# Altium footprint library Inductors SMD.PcbLib: 145 footprints (part 6 of 10)
Each footprint in its own frame and in the unit in brackets; x right, y up, seen from the top. Pads: shape width x height; smd on the part's side, far side on the other; paste and mask are expansions set on the pad; w line width, h text height; cw(c..) or ccw(c..) is an arc to the next point about the centre after c.
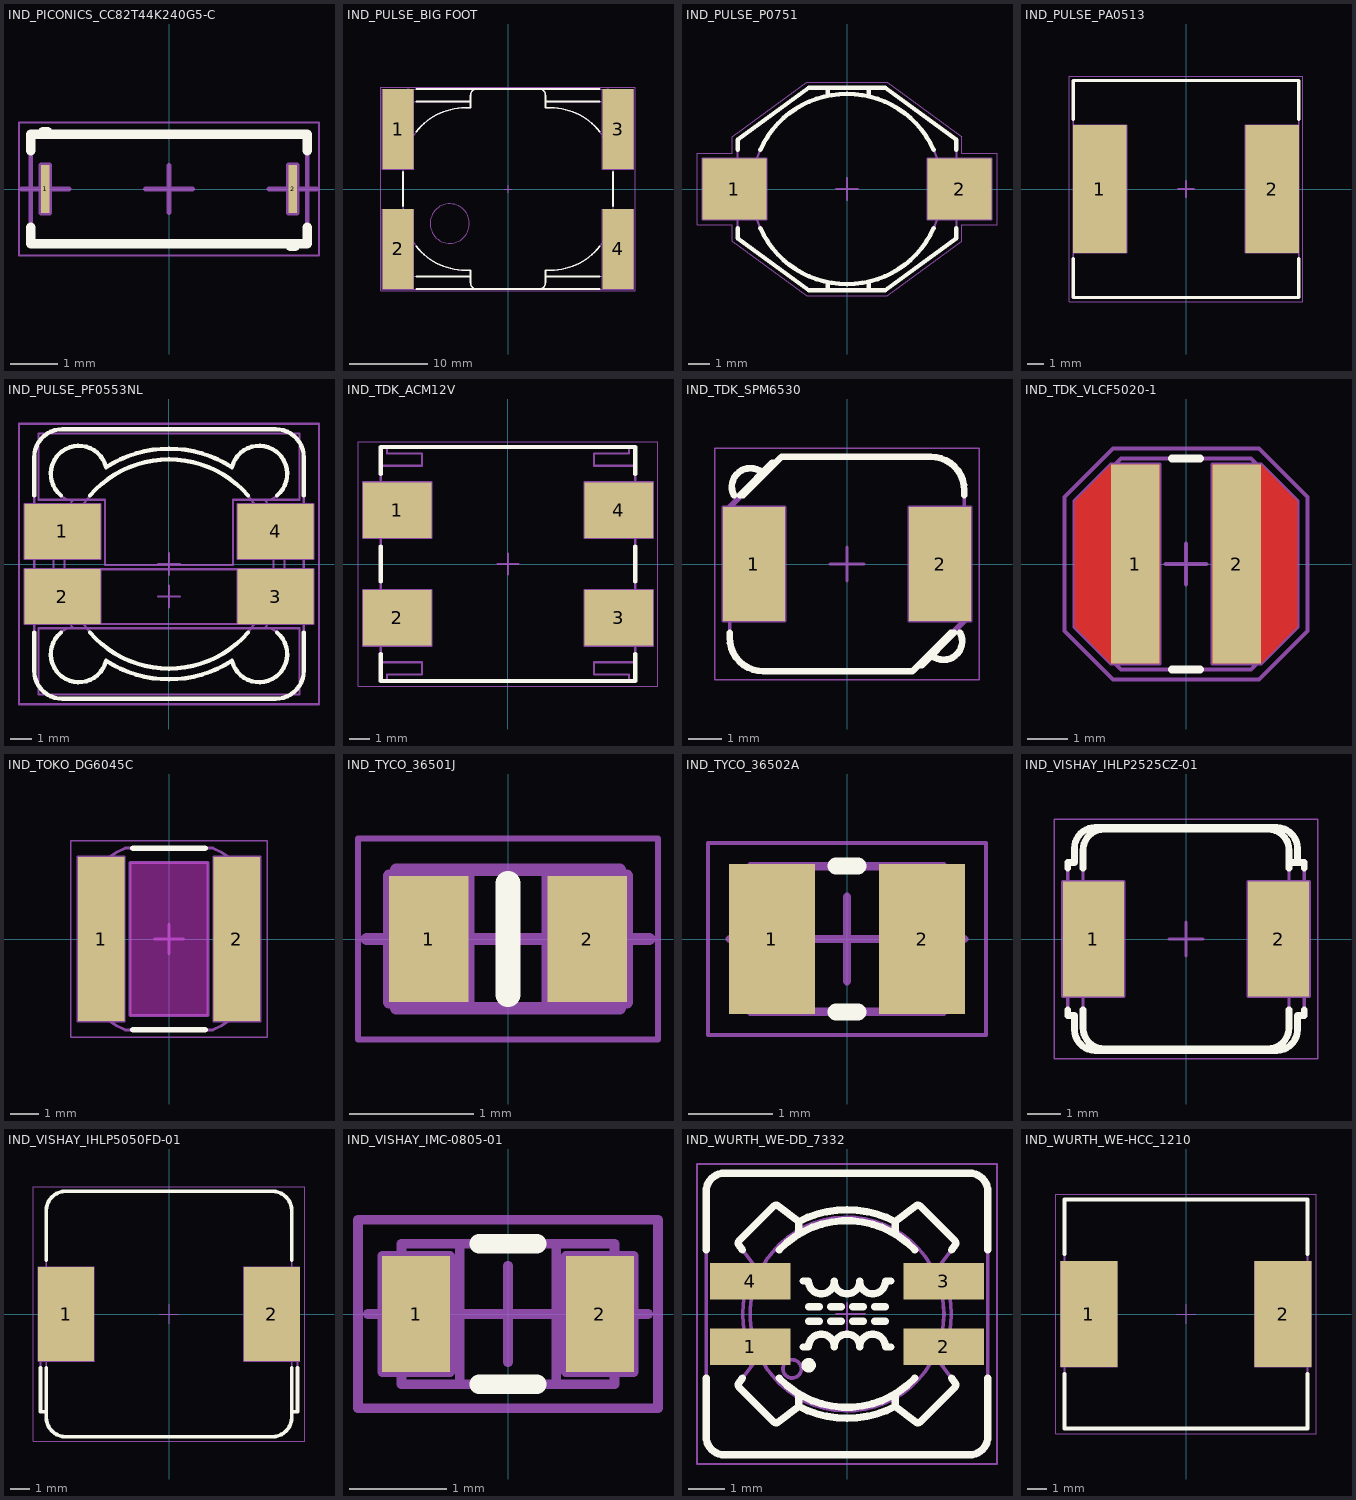
[diagram p5: the footprints below, top view; thin cyan lines are the x and y axes]

## IND_PICONICS_CC82T44K240G5-C [mil] "SMT Conical Inductor, Body 5.842x2.3114mm"
height 95.98
pads (2):
  rect 7.01x40 smd: 1(-103,0) 2(103,0)
Top Overlay:
  lines w7.87: -115,-31.81 -115,-45.5 115,-45.5 115,-31.81 ; -115,31.81 -115,45.5 115,45.5 115,31.81 ; -104.94,45.5 -104.94,47.47 -101.06,47.47 -101.06,45.5 ; 101.03,-45.5 101.03,-47.47 104.97,-47.47 104.97,-45.5
Mechanical 8:
  lines w3.94: -122.69,0 -103,0 ; -103,-19.69 -103,0 ; -103,19.69 -103,0 ; -83.31,0 -103,0 ; -19.69,0 0,0 ; 0,-19.69 0,0 ; 0,19.69 0,0 ; 19.69,0 0,0 ; 83.31,0 103,0 ; 103,-19.69 103,0 ; 103,19.69 103,0 ; 122.69,0 103,0 ; -106.5,-20 -99.5,-20 -99.5,20 -106.5,20 -106.5,-20 ; 99.5,-20 106.5,-20 106.5,20 99.5,20 99.5,-20
Mechanical 14:
  lines w3.94: -104.94,45.5 -104.94,47.47 -101.06,47.47 -101.06,45.5 ; 101.03,-45.5 101.03,-47.47 104.97,-47.47 104.97,-45.5 ; -115,-45.5 -115,45.5 115,45.5 115,-45.5 -115,-45.5
Mechanical 15:
  lines w1.97: -124.84,-55.34 124.84,-55.34 124.84,55.34 -124.84,55.34 -124.84,-55.34
3D body "IND_PICONICS_CC82T44K240G5-C.stp": height 96, standoff 0, extent -114.99,-47.46 115,47.48

## IND_PULSE_BIG FOOT [mm] "SMT Common Mode Choke, PULSE Big Foot Case, Body Width 27.94mm Body Lenght 25.4mm Height 12.7mm"
height 12.7
pads (4):
  rect 3.94x10.16 smd: 1(-13.97,7.62) 2(-13.97,-7.62) 3(13.97,7.62) 4(13.97,-7.62)
Top Overlay:
  lines w0.2: -11.65,-12.7 11.65,-12.7 ; -11.65,-11.112 -4.763,-11.112 ; -11.65,-7.275 ccw(c-5.398,-2.385) -5.398,-10.323 -4.763,-10.323 -4.763,-11.906 ccw(c-3.969,-11.906) -3.969,-12.7 3.969,-12.7 ccw(c3.969,-11.906) 4.763,-11.906 4.763,-10.323 5.397,-10.323 ccw(c5.398,-2.385) 11.65,-7.275 ; -11.65,7.275 cw(c-5.397,2.385) -5.398,10.323 -4.763,10.323 -4.763,11.906 cw(c-3.969,11.906) -3.969,12.7 3.969,12.7 cw(c3.969,11.906) 4.763,11.906 4.763,10.323 5.397,10.323 cw(c5.397,2.385) 11.65,7.275 ; -11.65,11.112 -4.763,11.112 ; -11.65,12.7 11.65,12.7 ; 4.763,-11.112 11.65,-11.112 ; 4.763,11.112 11.65,11.112 ; -13.335,-2.19 -13.335,2.19 -13.335,-2.19 ; 13.335,-2.19 13.335,2.19 13.335,-2.19
Mechanical 8:
  lines w0.1: -14.47,-7.62 -13.97,-7.62 ; -14.47,7.62 -13.97,7.62 ; -13.97,-8.12 -13.97,-7.62 ; -13.97,-7.12 -13.97,-7.62 ; -13.97,7.12 -13.97,7.62 ; -13.97,8.12 -13.97,7.62 ; -13.47,-7.62 -13.97,-7.62 ; -13.47,7.62 -13.97,7.62 ; -0.5,0 0,0 ; 0,-0.5 0,0 ; 0,0.5 0,0 ; 0.5,0 0,0 ; 13.47,-7.62 13.97,-7.62 ; 13.47,7.62 13.97,7.62 ; 13.97,-8.12 13.97,-7.62 ; 13.97,-7.12 13.97,-7.62 ; 13.97,7.12 13.97,7.62 ; 13.97,8.12 13.97,7.62 ; 14.47,-7.62 13.97,-7.62 ; 14.47,7.62 13.97,7.62 ; -15.94,-12.7 -15.94,-2.54 -12,-2.54 -12,-12.7 -15.94,-12.7 ; -15.94,2.54 -15.94,12.7 -12,12.7 -12,2.54 -15.94,2.54 ; 12,-12.7 12,-2.54 15.94,-2.54 15.94,-12.7 12,-12.7 ; 12,2.54 12,12.7 15.94,12.7 15.94,2.54 12,2.54
Mechanical 14:
  circle w0.1: c-7.398,-4.385 r2.5
  lines w0.1: -13.335,-11.906 -13.335,11.906 ; -4.763,-11.112 -12.541,-11.112 ccw(c-12.541,-11.906) -12.541,-12.7 12.541,-12.7 ccw(c12.541,-11.906) 12.541,-11.112 4.763,-11.112 ; -4.763,11.112 -12.541,11.112 cw(c-12.541,11.906) -12.541,12.7 12.541,12.7 cw(c12.541,11.906) 12.541,11.112 4.763,11.112 ; 13.335,-11.906 13.335,11.906 ; -13.335,-2.385 ccw(c-5.397,-2.385) -5.397,-10.323 -4.763,-10.323 -4.763,-11.906 ccw(c-3.969,-11.906) -3.969,-12.7 3.969,-12.7 ccw(c3.969,-11.906) 4.763,-11.906 4.763,-10.323 5.397,-10.323 ccw(c5.397,-2.385) 13.335,-2.385 13.335,2.385 ccw(c5.397,2.385) 5.398,10.323 4.763,10.323 4.763,11.906 ccw(c3.969,11.906) 3.969,12.7 -3.969,12.7 ccw(c-3.969,11.906) -4.763,11.906 -4.763,10.323 -5.397,10.323 ccw(c-5.397,2.385) -13.335,2.385 -13.335,-2.385
Mechanical 15:
  lines w0.05: -16.19,-12.95 16.19,-12.95 16.19,12.95 -16.19,12.95 -16.19,-12.95
3D body "IND_PULSE_BIG FOOT.stp": height 12.49, standoff 0.02, extent -15.526,-12.7 15.526,12.7

## IND_PULSE_P0751 [mm] "SMD Power Inductor, Body Width 9.4mm Body Lenght 12.95mm Height 5.46mm, PULSE P0751/52NL Series"
height 5.46
pads (2):
  rect 2.92x2.79 smd: 1(-5.145,0) 2(5.145,0)
Top Overlay:
  lines w0.2: -5,-1.795 -5,-2.25 -1.75,-4.625 1.75,-4.625 5,-2.25 5,-1.795 ; -5,1.795 -5,2.25 -1.75,4.625 1.75,4.625 5,2.25 5,1.795 ; -3.962,-1.795 ccw(c0,0) 3.962,-1.795 ; -3.962,1.795 cw(c0,0) 3.962,1.795 ; -0.886,-4.625 -0.886,-4.259 ; -0.886,4.259 -0.886,4.625 ; 0.999,-4.625 0.999,-4.234 ; 0.999,4.234 0.999,4.625
Mechanical 8:
  lines w0.1: -5.645,0 -5.145,0 ; -5.145,-0.5 -5.145,0 ; -5.145,0.5 -5.145,0 ; -4.645,0 -5.145,0 ; -0.5,0 0,0 ; 0,-0.5 0,0 ; 0,0.5 0,0 ; 0.5,0 0,0 ; 4.645,0 5.145,0 ; 5.145,-0.5 5.145,0 ; 5.145,0.5 5.145,0 ; 5.645,0 5.145,0 ; -6.605,-1.395 -3.685,-1.395 -3.685,1.395 -6.605,1.395 -6.605,-1.395 ; 3.685,-1.395 6.605,-1.395 6.605,1.395 3.685,1.395 3.685,-1.395
Mechanical 14:
  circle w0.1: c0,0 r4.35
  lines w0.1: -0.886,-4.625 -0.886,-4.259 ; -0.886,4.259 -0.886,4.625 ; 0.999,-4.625 0.999,-4.234 ; 0.999,4.234 0.999,4.625 ; -6.3,-1.25 -6.3,1.25 -5,1.25 -5,2.25 -1.75,4.625 1.75,4.625 5,2.25 5,1.25 6.3,1.25 6.3,-1.25 5,-1.25 5,-2.25 1.75,-4.625 -1.75,-4.625 -5,-2.25 -5,-1.25 -6.3,-1.25
Mechanical 15:
  lines w0.05: -6.855,-1.645 -5.25,-1.645 -5.25,-2.377 -1.832,-4.875 1.832,-4.875 5.25,-2.377 5.25,-1.645 6.855,-1.645 6.855,1.645 5.25,1.645 5.25,2.377 1.832,4.875 -1.832,4.875 -5.25,2.377 -5.25,1.645 -6.855,1.645 -6.855,-1.645
3D body "IND_PULSE_P0751.stp": height 4.75, standoff 0, extent -6.3,-4.625 6.3,4.625

## IND_PULSE_PA0513 [mm] "SMD Power Inductor, Body Width 13.46mm Body Lenght 12.95mm Height 8mm, PULSE PA0513 Series"
height 8
pads (2):
  rect 3.18x7.62 smd: 1(-5.145,0) 2(5.145,0)
Top Overlay:
  lines w0.2: -6.73,-4.16 -6.73,-6.475 6.73,-6.475 6.73,-4.16 ; -6.73,4.16 -6.73,6.475 6.73,6.475 6.73,4.16
Mechanical 8:
  lines w0.1: -5.645,0 -5.145,0 ; -5.145,-0.5 -5.145,0 ; -5.145,0.5 -5.145,0 ; -4.645,0 -5.145,0 ; -0.5,0 0,0 ; 0,-0.5 0,0 ; 0,0.5 0,0 ; 0.5,0 0,0 ; 4.645,0 5.145,0 ; 5.145,-0.5 5.145,0 ; 5.145,0.5 5.145,0 ; 5.645,0 5.145,0 ; -6.735,-3.81 -6.735,3.81 -3.555,3.81 -3.555,-3.81 -6.735,-3.81 ; 3.555,-3.81 3.555,3.81 6.735,3.81 6.735,-3.81 3.555,-3.81
Mechanical 14:
  lines w0.1: -6.73,-6.475 6.73,-6.475 6.73,6.475 -6.73,6.475 -6.73,-6.475
Mechanical 15:
  lines w0.05: -6.98,-6.725 6.98,-6.725 6.98,6.725 -6.98,6.725 -6.98,-6.725
3D body "IND_PULSE_PA0513.stp": height 8, standoff 0, extent -6.73,-6.475 6.73,6.475

## IND_PULSE_PF0553NL [mm] "SMD Power Inductor, Body Width 12.5mm Body Lenght 12.5mm Height 8mm, PULSE PF0553NL Series"
height 8
pads (4):
  rect 3.53x2.54 smd: 1(-4.94,1.51) 2(-4.94,-1.51) 3(4.94,-1.51) 4(4.94,1.51)
Top Overlay:
  lines w0.2: -6.25,-3.18 -6.25,-4.95 ccw(c-4.95,-4.95) -4.95,-6.25 4.95,-6.25 ccw(c4.95,-4.95) 6.25,-4.95 6.25,-3.18 ; -6.25,3.18 -6.25,4.95 cw(c-4.95,4.95) -4.95,6.25 4.95,6.25 cw(c4.95,4.95) 6.25,4.95 6.25,3.18 ; -5.01,-3.18 ccw(c-4.182,-4.183) -2.918,-4.484 ccw(c0,0) 2.918,-4.484 ccw(c4.183,-4.183) 5.01,-3.18 ; -5.01,3.18 cw(c-4.182,4.183) -2.918,4.484 cw(c0,0) 2.918,4.484 cw(c4.183,4.183) 5.01,3.18 ; -3.662,-3.18 ccw(c0,0) 3.662,-3.18 ; -3.662,3.18 cw(c0,0) 3.662,3.18
Mechanical 8:
  lines w0.1: -5.44,-1.51 -4.94,-1.51 ; -5.44,1.51 -4.94,1.51 ; -4.94,-2.01 -4.94,-1.51 ; -4.94,-1.01 -4.94,-1.51 ; -4.94,1.01 -4.94,1.51 ; -4.94,2.01 -4.94,1.51 ; -4.44,-1.51 -4.94,-1.51 ; -4.44,1.51 -4.94,1.51 ; -0.5,-1.51 0,-1.51 ; -0.5,0 0,0 ; 0,-2.01 0,-1.51 ; 0,-1.01 0,-1.51 ; 0,-0.5 0,0 ; 0,0.5 0,0 ; 0.5,-1.51 0,-1.51 ; 0.5,0 0,0 ; 4.44,-1.51 4.94,-1.51 ; 4.44,1.51 4.94,1.51 ; 4.94,-2.01 4.94,-1.51 ; 4.94,-1.01 4.94,-1.51 ; 4.94,1.01 4.94,1.51 ; 4.94,2.01 4.94,1.51 ; 5.44,-1.51 4.94,-1.51 ; 5.44,1.51 4.94,1.51 ; -3.175,-2.78 3.175,-2.78 ; -3.175,-2.78 -3.175,-0.24 ; -3.175,-2.78 -6.705,-2.78 -6.705,-0.24 -3.175,-0.24 ; -3.175,-0.24 3.175,-0.24 ; 3.175,-2.78 3.175,-0.24 ; 3.175,-2.78 6.705,-2.78 6.705,-0.24 3.175,-0.24 ; -6.705,0.24 -6.705,2.78 -3.175,2.78 -3.175,0.24 -6.705,0.24 ; -6.05,-6.05 -6.05,-2.98 6.05,-2.98 6.05,-6.05 -6.05,-6.05 ; -6.05,2.98 -6.05,6.05 6.05,6.05 6.05,2.98 2.975,2.98 2.975,-0.04 -2.975,-0.04 -2.975,2.98 -6.05,2.98 ; 3.175,0.24 3.175,2.78 6.705,2.78 6.705,0.24 3.175,0.24
Mechanical 14:
  circle w0.1: c0,0 r4.85
  lines w0.1: -6.25,-4.95 ccw(c-4.95,-4.95) -4.95,-6.25 4.95,-6.25 ccw(c4.95,-4.95) 6.25,-4.95 6.25,4.95 ccw(c4.95,4.95) 4.95,6.25 -4.95,6.25 ccw(c-4.95,4.95) -6.25,4.95 -6.25,-4.95 ; -4.484,-2.918 ccw(c-4.182,-4.183) -2.918,-4.484 ccw(c0,0) 2.918,-4.484 ccw(c4.183,-4.183) 4.484,-2.918 ccw(c0,0) 4.484,2.918 ccw(c4.183,4.183) 2.918,4.484 ccw(c0,0) -2.918,4.484 ccw(c-4.182,4.183) -4.484,2.918 ccw(c0,0) -4.484,-2.918
Mechanical 15:
  lines w0.1: -6.955,-6.5 6.955,-6.5 6.955,6.5 -6.955,6.5 -6.955,-6.5
3D body "IND_PULSE_PF0553NL.stp": height 8, standoff 0, extent -6.25,-6.315 6.25,6.315

## IND_TDK_ACM12V [mm] "Common Mode Filters For Automotive Power Line, 12mm L X 11mm W X 6mm H, TDK ACM70V Series"
height 6
pads (4):
  rect 3.3x2.7 smd: 1(-5.35,2.6) 2(-5.35,-2.6) 3(5.35,-2.6) 4(5.35,2.6)
Top Overlay:
  lines w0.2: -6.15,-4.35 -6.15,-5.65 6.15,-5.65 6.15,-4.35 ; -6.15,-0.85 -6.15,0.85 ; -6.15,4.35 -6.15,5.65 6.15,5.65 6.15,4.35 ; 6.15,-0.85 6.15,0.85
Mechanical 8:
  lines w0.1: -5.85,-2.6 -5.35,-2.6 ; -5.85,2.6 -5.35,2.6 ; -5.35,-3.1 -5.35,-2.6 ; -5.35,-2.1 -5.35,-2.6 ; -5.35,2.1 -5.35,2.6 ; -5.35,3.1 -5.35,2.6 ; -4.85,-2.6 -5.35,-2.6 ; -4.85,2.6 -5.35,2.6 ; -0.5,0 0,0 ; 0,-0.5 0,0 ; 0,0.5 0,0 ; 0.5,0 0,0 ; 4.85,-2.6 5.35,-2.6 ; 4.85,2.6 5.35,2.6 ; 5.35,-3.1 5.35,-2.6 ; 5.35,-2.1 5.35,-2.6 ; 5.35,2.1 5.35,2.6 ; 5.35,3.1 5.35,2.6 ; 5.85,-2.6 5.35,-2.6 ; 5.85,2.6 5.35,2.6 ; -7,-3.95 -3.7,-3.95 -3.7,-1.25 -7,-1.25 -7,-3.95 ; -7,1.25 -3.7,1.25 -3.7,3.95 -7,3.95 -7,1.25 ; 3.7,-3.95 7,-3.95 7,-1.25 3.7,-1.25 3.7,-3.95 ; 3.7,1.25 7,1.25 7,3.95 3.7,3.95 3.7,1.25
Mechanical 14:
  lines w0.1: -6.15,-4.75 -6.15,4.75 -4.15,4.75 -4.15,5.35 -5.85,5.35 -5.85,5.65 5.85,5.65 5.85,5.35 4.15,5.35 4.15,4.75 6.15,4.75 6.15,-4.75 4.15,-4.75 4.15,-5.35 5.85,-5.35 5.85,-5.65 -5.85,-5.65 -5.85,-5.35 -4.15,-5.35 -4.15,-4.75 -6.15,-4.75
Mechanical 15:
  lines w0.05: -7.25,-5.9 7.25,-5.9 7.25,5.9 -7.25,5.9 -7.25,-5.9
3D body "IND_TDK_ACM12V.stp": height 6, standoff 0, extent -6.15,-5.65 6.15,5.65

## IND_TDK_SPM6530 [mm] "SMD Inductor, 7.1mm L X 6.5mm W X 3mm H, TDK SPM6530 Series"
height 3
pads (2):
  rect 1.85x3.4 smd: 1(-2.775,0) 2(2.775,0)
Top Overlay:
  lines w0.2: -3.5,-2.05 -3.5,-2.2 ccw(c-2.5,-2.2) -2.5,-3.2 1.95,-3.2 3.1,-2.05 ; -3.373,2.05 cw(c-2.883,2.307) -2.532,2.733 -2.524,2.726 ; -3.2,2.05 -2.227,3.023 -2.127,3.023 ; -3.1,2.05 -1.95,3.2 2.5,3.2 cw(c2.5,2.2) 3.5,2.2 3.5,2.05 ; 2.127,-3.023 2.227,-3.023 3.2,-2.05 ; 2.524,-2.726 2.532,-2.733 ccw(c2.883,-2.307) 3.373,-2.05
Mechanical 8:
  lines w0.1: -3.275,0 -2.775,0 ; -2.775,-0.5 -2.775,0 ; -2.775,0.5 -2.775,0 ; -2.275,0 -2.775,0 ; -0.5,0 0,0 ; 0,-0.5 0,0 ; 0,0.5 0,0 ; 0.5,0 0,0 ; 2.275,0 2.775,0 ; 2.775,-0.5 2.775,0 ; 2.775,0.5 2.775,0 ; 3.275,0 2.775,0 ; -3.7,-1.7 -3.7,1.7 -1.85,1.7 -1.85,-1.7 -3.7,-1.7 ; 1.85,-1.7 3.7,-1.7 3.7,1.7 1.85,1.7 1.85,-1.7
Mechanical 14:
  lines w0.1: -3.5,-1.6 -3.6,-1.6 -3.6,1.65 ; -3.302,1.948 -3.309,1.955 cw(c-2.883,2.307) -2.532,2.733 -2.524,2.726 ; -2.127,3.023 -2.227,3.023 -3.6,1.65 ; 2.127,-3.023 2.227,-3.023 3.6,-1.65 ; 2.524,-2.726 2.532,-2.733 ccw(c2.883,-2.307) 3.309,-1.955 3.302,-1.948 ; 3.5,1.6 3.6,1.6 3.6,-1.65 ; -3.6,1.65 -3.5,1.65 ; -3.5,1.65 -1.95,3.2 2.5,3.2 cw(c2.5,2.2) 3.5,2.2 3.5,0.9 2.564,0.9 2.564,1 ccw(c2.295,1) 2.025,1 2.025,-1 ccw(c2.295,-1) 2.564,-1 2.564,-0.9 3.5,-0.9 3.5,-1.65 ; -3.5,1.65 -3.5,0.9 -2.564,0.9 -2.564,1 cw(c-2.295,1) -2.025,1 -2.025,-1 cw(c-2.295,-1) -2.564,-1 -2.564,-0.9 -3.5,-0.9 -3.5,-2.2 ccw(c-2.5,-2.2) -2.5,-3.2 1.95,-3.2 3.5,-1.65 ; 3.5,-1.65 3.6,-1.65
Mechanical 15:
  lines w0.05: -3.95,-3.45 3.95,-3.45 3.95,3.45 -3.95,3.45 -3.95,-3.45
3D body "IND_TDK_SPM6530.stp": height 3.1, standoff 0, extent -3.6,-3.2 3.6,3.2

## IND_TDK_VLCF5020-1 [mm] "SMD Inductor, 5mm L X 5mm W X 2mm H, TDK VLCF5020-1 Case"
height 2
pads (2):
  rect 1.2x4.9 smd: 1(-1.25,0) 2(1.25,0)
Top Layer:
  region: -2.75,-1.55 -1.85,-2.45 -0.65,-2.45 -0.65,2.45 -1.85,2.45 -2.75,1.55
  region: 2.75,1.55 1.85,2.45 0.65,2.45 0.65,-2.45 1.85,-2.45 2.75,-1.55
Top Overlay:
  lines w0.2: -0.35,-2.6 0.35,-2.6 ; -0.35,2.6 0.35,2.6
Top Paste:
  region: -2.75,-1.55 -1.85,-2.45 -0.65,-2.45 -0.65,2.45 -1.85,2.45 -2.75,1.55
  region: 2.75,1.55 1.85,2.45 0.65,2.45 0.65,-2.45 1.85,-2.45 2.75,-1.55
Top Solder:
  region: 2.85,1.591 1.891,2.55 0.55,2.55 0.55,-2.55 1.891,-2.55 2.85,-1.591
  region: -2.85,-1.591 -1.891,-2.55 -0.55,-2.55 -0.55,2.55 -1.891,2.55 -2.85,1.591
Mechanical 8:
  lines w0.1: -2.2,0 -1.7,0 ; -1.7,-0.5 -1.7,0 ; -1.7,0.5 -1.7,0 ; -1.25,-0.5 -1.25,0 ; -1.25,0.5 -1.25,0 ; -0.75,0 -1.25,0 ; -0.5,0 0,0 ; 0,-0.5 0,0 ; 0,0.5 0,0 ; 0.5,0 0,0 ; 0.75,0 1.25,0 ; 1.25,-0.5 1.25,0 ; 1.25,0.5 1.25,0 ; 1.7,-0.5 1.7,0 ; 1.7,0.5 1.7,0 ; 2.2,0 1.7,0 ; -2.75,-1.55 -2.75,1.55 -1.85,2.45 -0.65,2.45 -0.65,-2.45 -1.85,-2.45 -2.75,-1.55 ; 0.65,-2.45 0.65,2.45 1.85,2.45 2.75,1.55 2.75,-1.55 1.85,-2.45 0.65,-2.45
Mechanical 14:
  lines w0.1: -2.6,-1.6 -1.6,-2.6 1.6,-2.6 2.6,-1.6 2.6,1.6 1.6,2.6 -1.6,2.6 -2.6,1.6 -2.6,-1.6
Mechanical 15:
  lines w0.1: -3,-1.654 -3,1.654 -1.804,2.85 1.804,2.85 3,1.654 3,-1.654 1.804,-2.85 -1.804,-2.85 -3,-1.654
3D body "IND_TDK_VLCF5020-1.stp": height 2, standoff 0, extent -2.6,-2.6 2.6,2.6

## IND_TOKO_DG6045C [mm] "Surface Mount Ferrite Inductor, 6.3mm L X 6.3mm W X 4.5mm H, MURATA/TOKO DG6045C Series"
height 4.5
pads (2):
  rect 1.6x5.7 smd: 1(-2.35,0) 2(2.35,0)
Top Layer keep-out:
  region: -1.35,2.65 1.35,2.65 1.35,-2.65 -1.35,-2.65
Top Overlay:
  lines w0.2: -1.25,-3.15 1.25,-3.15 ; -1.25,3.15 1.25,3.15
Mechanical 8:
  lines w0.1: -2.85,0 -2.35,0 ; -2.35,-0.5 -2.35,0 ; -2.35,0.5 -2.35,0 ; -1.85,0 -2.35,0 ; -0.5,0 0,0 ; 0,-0.5 0,0 ; 0,0.5 0,0 ; 0.5,0 0,0 ; 1.85,0 2.35,0 ; 2.35,-0.5 2.35,0 ; 2.35,0.5 2.35,0 ; 2.85,0 2.35,0 ; -3.15,-2.85 -1.55,-2.85 -1.55,2.85 -3.15,2.85 -3.15,-2.85 ; -1.35,-2.65 -1.35,2.65 1.35,2.65 1.35,-2.65 -1.35,-2.65 ; 1.55,-2.85 3.15,-2.85 3.15,2.85 1.55,2.85 1.55,-2.85
Mechanical 14:
  lines w0.1: -3.05,-2.65 -3.05,2.65 ; -2.722,-2.165 -2.75,-2.165 -2.75,-2.65 -3.15,-2.65 -3.15,2.65 -2.75,2.65 -2.75,2.165 -2.722,2.165 ; 2.722,-2.165 2.75,-2.165 2.75,-2.65 3.15,-2.65 3.15,2.65 2.75,2.65 2.75,2.165 2.722,2.165 ; 3.05,-2.65 3.05,-1.526 ; 3.05,2.65 3.05,1.526 ; 3.05,-1.526 cw(c0.408,-0.574) 1.526,-3.15 -1.526,-3.15 cw(c-0.408,-0.574) -3.05,-1.526 -3.05,1.526 cw(c-0.408,0.574) -1.526,3.15 1.526,3.15 cw(c0.408,0.574) 3.05,1.526 ; 3.05,-1.526 3.05,1.526
Mechanical 15:
  lines w0.05: -3.4,-3.4 -3.4,3.4 3.4,3.4 3.4,-3.4 -3.4,-3.4
3D body "IND_TOKO_DG6045C.stp": height 4.5, standoff 0, extent -3.15,-3.15 3.15,3.15

## IND_TYCO_36501J [mm] "Chip Inductor, 2-Leads, Body 108 x 1.12mm, TYCO 3650J Series"
height 1.02
pads (2):
  rect 0.64x1.02 smd: 1(-0.64,0) 2(0.64,0)
Top Overlay:
  lines w0.2: 0,-0.45 0,0.45
Mechanical 8:
  lines w0.1: -1.14,0 -0.64,0 ; -0.64,-0.5 -0.64,0 ; -0.64,0.5 -0.64,0 ; -0.5,0 0,0 ; 0,-0.5 0,0 ; 0,0.5 0,0 ; 0.5,0 0,0 ; 0.64,-0.5 0.64,0 ; 0.64,0.5 0.64,0 ; 1.14,0 0.64,0 ; -0.96,-0.51 -0.96,0.51 -0.32,0.51 -0.32,-0.51 -0.96,-0.51 ; 0.32,-0.51 0.32,0.51 0.96,0.51 0.96,-0.51 0.32,-0.51
Mechanical 14:
  lines w0.1: -0.9,-0.56 0.9,-0.56 0.9,0.56 -0.9,0.56 -0.9,-0.56
Mechanical 15:
  lines w0.05: -1.21,-0.81 -1.21,0.81 1.21,0.81 1.21,-0.81 -1.21,-0.81
3D body "IND_TYCO_36501J.stp": height 1.02, standoff 0, extent -0.9,-0.56 0.9,0.56

## IND_TYCO_36502A [mm] "Chip Inductor, 2-Leads, EIA 0805, Metric 2012, Body L 2.29 x W 1.73mm x H 1.52mm"
height 1.52
pads (2):
  rect 1.02x1.78 smd: 1(-0.89,0) 2(0.89,0)
Top Overlay:
  lines w0.2: -0.13,-0.865 0.13,-0.865 ; -0.13,0.865 0.13,0.865
Mechanical 8:
  lines w0.1: -1.39,0 -0.89,0 ; -0.89,-0.5 -0.89,0 ; -0.89,0.5 -0.89,0 ; 0.89,-0.5 0.89,0 ; 0.89,0.5 0.89,0 ; 1.39,0 0.89,0 ; 0,0 -0.5,0 0,0 ; 0,0 0,-0.5 0,0 ; 0,0 0.5,0 0,0 ; 0,0 0,0.5 0,0
Mechanical 14:
  lines w0.1: -1.145,-0.865 -1.145,0.865 1.145,0.865 1.145,-0.865 -1.145,-0.865
Mechanical 15:
  lines w0.05: -1.65,-1.14 -1.65,1.14 1.65,1.14 1.65,-1.14 -1.65,-1.14
3D body "IND_TYCO_36502A.stp": height 1.52, standoff 0, extent -1.145,-0.865 1.145,0.865

## IND_VISHAY_IHLP2525CZ-01 [mm]
height 3
pads (2):
  rect 1.83x3.43 smd: 1(-2.77,0) 2(2.77,0)
Top Overlay:
  lines w0.2: -3.538,-2.115 -3.538,-2.286 -3.335,-2.286 -3.335,-2.71 ccw(c-2.71,-2.71) -2.71,-3.334 2.71,-3.334 ccw(c2.71,-2.71) 3.335,-2.71 3.334,-2.286 3.538,-2.286 3.538,-2.115 ; -3.538,2.115 -3.538,2.286 -3.335,2.286 -3.335,2.711 cw(c-2.71,2.711) -2.71,3.336 2.71,3.336 cw(c2.71,2.711) 3.335,2.711 3.334,2.286 ; -3.081,-2.115 -3.081,-2.649 ccw(c-2.446,-2.649) -2.446,-3.284 2.446,-3.284 ccw(c2.446,-2.649) 3.081,-2.649 3.081,-2.115 ; -3.081,2.115 -3.081,2.65 cw(c-2.446,2.65) -2.446,3.285 2.446,3.285 cw(c2.446,2.65) 3.081,2.65 3.081,2.115 ; 3.081,2.286 3.334,2.286 ; 3.538,2.115 3.538,2.286 3.334,2.286
Mechanical 8:
  lines w0.1: -3.27,0 -2.77,0 ; -2.77,-0.5 -2.77,0 ; -2.77,0.5 -2.77,0 ; -2.27,0 -2.77,0 ; -0.5,0 0,0 ; 0,-0.5 0,0 ; 0,0.5 0,0 ; 0.5,0 0,0 ; 2.27,0 2.77,0 ; 2.77,-0.5 2.77,0 ; 2.77,0.5 2.77,0 ; 3.27,0 2.77,0 ; -3.685,-1.715 -1.855,-1.715 -1.855,1.715 -3.685,1.715 -3.685,-1.715 ; 1.855,-1.715 1.855,1.715 3.685,1.715 3.685,-1.715 1.855,-1.715
Mechanical 14:
  lines w0.1: -3.081,-0.381 -3.302,-0.381 -3.302,0.381 -3.081,0.381 ; 3.081,-0.381 3.302,-0.381 3.302,0.381 3.081,0.381 ; 3.081,2.286 3.334,2.286 ; 3.334,2.286 3.538,2.286 3.538,-2.286 3.334,-2.286 3.335,-2.71 cw(c2.71,-2.71) 2.71,-3.334 -2.71,-3.334 cw(c-2.71,-2.71) -3.335,-2.71 -3.335,-2.286 -3.538,-2.286 -3.538,2.286 -3.335,2.286 -3.335,2.711 cw(c-2.71,2.711) -2.71,3.336 2.71,3.336 cw(c2.71,2.711) 3.335,2.711 3.334,2.286 ; -3.081,-2.649 ccw(c-2.446,-2.649) -2.446,-3.284 2.446,-3.284 ccw(c2.446,-2.649) 3.081,-2.649 3.081,2.65 ccw(c2.446,2.65) 2.446,3.285 -2.446,3.285 ccw(c-2.446,2.65) -3.081,2.65 -3.081,-2.649
Mechanical 15:
  lines w0.05: -3.935,-3.584 -3.935,3.586 3.935,3.586 3.935,-3.584 -3.935,-3.584
3D body "IND_VISHAY_IHLP2525CZ-01.stp": height 2.88, standoff 0, extent -3.538,-3.334 3.538,3.336

## IND_VISHAY_IHLP5050FD-01 [mm] "Inductor, Molded Body; 13.2mm L X 12.9mm W X 6.5mm H"
height 6.5
pads (2):
  rect 2.945x4.95 smd: 1(-5.407,0) 2(5.407,0)
Top Overlay:
  lines w0.2: -6.757,-2.825 -6.757,-5.136 -6.448,-5.136 ; -6.448,-2.825 -6.448,-5.431 ccw(c-5.431,-5.431) -5.431,-6.448 5.431,-6.448 ccw(c5.431,-5.431) 6.448,-5.431 6.448,-2.825 ; -6.448,2.825 -6.448,5.431 cw(c-5.431,5.431) -5.431,6.448 5.431,6.448 cw(c5.431,5.431) 6.448,5.431 6.448,2.825 ; 6.448,-5.136 6.75,-5.136 6.75,-2.825
Mechanical 8:
  lines w0.05: -0.5,0 0,0 ; 0,-0.5 0,0 ; 0,0.5 0,0 ; 0.5,0 0,0 ; -6.88,-2.475 -3.935,-2.475 ; -6.88,-2.475 -6.88,2.475 -3.935,2.475 -3.935,-2.475 ; -6.88,-2.475 -5.407,0 ; -6.88,-2.475 -5.407,0 ; -5.407,0 -3.935,-2.475 ; 3.935,-2.475 6.88,-2.475 ; 3.935,-2.475 3.935,2.475 6.88,2.475 6.88,-2.475 ; 3.935,-2.475 5.407,0 ; 3.935,-2.475 5.407,0 ; 5.407,0 6.88,-2.475
Mechanical 14:
  lines w0.1: -6.448,-5.136 -6.757,-5.136 -6.757,2.375 -6.448,2.375 ; 6.448,-5.136 6.75,-5.136 6.75,2.375 6.448,2.375 ; -6.448,-5.431 ccw(c-5.431,-5.431) -5.431,-6.448 5.431,-6.448 ccw(c5.431,-5.431) 6.448,-5.431 6.448,5.431 ccw(c5.431,5.431) 5.431,6.448 -5.431,6.448 ccw(c-5.431,5.431) -6.448,5.431 -6.448,-5.431
Mechanical 15:
  lines w0.05: -0.5,0 0,0 ; 0,-0.5 0,0 ; 0,0.5 0,0 ; 0.5,0 0,0 ; -7.13,-6.7 7.13,-6.7 7.13,6.7 -7.13,6.7 -7.13,-6.7
3D body "IND_VISHAY_IHLP5050FD-01.stp": height 6.5, standoff -0.03, extent -6.756,-6.448 6.757,6.449

## IND_VISHAY_IMC-0805-01 [mm] "Chip Inductor, EIA 0805, Metric 2012, Body 2.0x1.25mm"
height 1.4
pads (2):
  rect 0.7x1.2 smd: 1(-0.95,0) 2(0.95,0)
Top Overlay:
  lines w0.2: -0.3,-0.725 0.3,-0.725 ; -0.3,0.725 0.3,0.725
Mechanical 8:
  lines w0.1: -1.45,0 -0.95,0 ; -0.95,-0.5 -0.95,0 ; -0.95,0.5 -0.95,0 ; -0.5,0 0,0 ; 0,-0.5 0,0 ; 0,0.5 0,0 ; 0.5,0 0,0 ; 0.95,-0.5 0.95,0 ; 0.95,0.5 0.95,0 ; 1.45,0 0.95,0 ; -1.3,-0.6 -0.6,-0.6 -0.6,0.6 -1.3,0.6 -1.3,-0.6 ; 0.6,-0.6 0.6,0.6 1.3,0.6 1.3,-0.6 0.6,-0.6
Mechanical 14:
  lines w0.1: -0.5,-0.725 -0.5,0.725 ; 0.5,-0.725 0.5,0.725 ; -1.1,-0.725 1.1,-0.725 1.1,0.725 -1.1,0.725 -1.1,-0.725
Mechanical 15:
  lines w0.1: -1.55,-0.975 1.55,-0.975 1.55,0.975 -1.55,0.975 -1.55,-0.975
3D body "IND_VISHAY_IMC-0805-01.stp": height 1.4, standoff 0, extent -1.1,-0.725 1.1,0.725

## IND_WURTH_WE-DD_7332 [mm] "Power Choke, WE-DD Serie, Body 7.7x7.7mm"
height 4
pads (4):
  rect 2.2x1 smd: 1(-2.65,-0.9) 2(2.65,-0.9) 3(2.65,0.9) 4(-2.65,0.9)
Top Overlay:
  circle w0.2: c-1.05,-1.4 r0.1
  lines w0.2: -3.85,-1.75 -3.85,-3.35 ccw(c-3.35,-3.35) -3.35,-3.85 3.35,-3.85 ccw(c3.35,-3.35) 3.85,-3.35 3.85,-1.75 ; -3.85,1.75 -3.85,3.35 cw(c-3.35,3.35) -3.35,3.85 3.35,3.85 cw(c3.35,3.35) 3.85,3.35 3.85,1.75 ; -2.855,-1.75 -2.951,-1.875 ccw(c-2.872,-1.936) -2.943,-2.007 -2.007,-2.943 ccw(c-1.936,-2.872) -1.875,-2.951 -1.322,-2.525 ; -2.855,1.75 -2.951,1.875 cw(c-2.872,1.936) -2.943,2.007 -2.007,2.943 cw(c-1.936,2.872) -1.875,2.951 -1.322,2.525 ; -1.855,-1.75 ccw(c0,0) 1.855,-1.75 ; -1.855,1.75 cw(c0,0) 1.855,1.75 ; -1.322,-2.18 -1.322,-2.525 ; -1.322,2.18 -1.322,2.525 ; -1.2,-0.9 -1.05,-0.9 cw(c-0.7,-0.9) -0.35,-0.9 cw(c0,-0.9) 0.35,-0.9 cw(c0.7,-0.9) 1.05,-0.9 1.2,-0.9 ; -1.2,0.9 -1.05,0.9 ccw(c-0.7,0.9) -0.35,0.9 ccw(c0,0.9) 0.35,0.9 ccw(c0.7,0.9) 1.05,0.9 1.2,0.9 ; -1.05,-0.2 -0.75,-0.2 ; -1.05,0.2 -0.75,0.2 ; -0.45,-0.2 -0.15,-0.2 ; -0.45,0.2 -0.15,0.2 ; 0.15,-0.2 0.45,-0.2 ; 0.15,0.2 0.45,0.2 ; 0.75,-0.2 1.05,-0.2 ; 0.75,0.2 1.05,0.2 ; 1.322,-2.18 1.322,-2.525 ; 1.322,2.18 1.322,2.525 ; 2.855,-1.75 2.951,-1.875 cw(c2.872,-1.936) 2.943,-2.007 2.007,-2.943 cw(c1.936,-2.872) 1.875,-2.951 1.322,-2.525 ; 2.855,1.75 2.951,1.875 ccw(c2.872,1.936) 2.943,2.007 2.007,2.943 ccw(c1.936,2.872) 1.875,2.951 1.322,2.525 ; -1.322,-2.525 ccw(c0,0) 1.322,-2.525 ; -1.322,2.525 cw(c0,0) 1.322,2.525
Mechanical 8:
  lines w0.05: -2.65,-1.4 -2.65,-0.9 -2.15,-0.9 ; -2.65,0.4 -2.65,0.9 -2.15,0.9 ; 0,-0.5 0,0 0.5,0 ; 2.65,-1.4 2.65,-0.9 3.15,-0.9 ; 2.65,0.4 2.65,0.9 3.15,0.9
Mechanical 14:
  circle w0.1: c0,0 r2.65
  circle w0.1: c-1.5,-1.5 r0.25
  lines w0.1: -2.296,-1.322 -2.525,-1.322 ; -2.296,1.322 -2.525,1.322 ; -1.322,-2.296 -1.322,-2.525 ; -1.322,2.296 -1.322,2.525 ; -1.2,-0.9 -1.05,-0.9 cw(c-0.7,-0.9) -0.35,-0.9 cw(c0,-0.9) 0.35,-0.9 cw(c0.7,-0.9) 1.05,-0.9 1.2,-0.9 ; -1.2,0.9 -1.05,0.9 ccw(c-0.7,0.9) -0.35,0.9 ccw(c0,0.9) 0.35,0.9 ccw(c0.7,0.9) 1.05,0.9 1.2,0.9 ; -1.05,-0.2 -0.75,-0.2 ; -1.05,0.2 -0.75,0.2 ; -0.45,-0.2 -0.15,-0.2 ; -0.45,0.2 -0.15,0.2 ; 0.15,-0.2 0.45,-0.2 ; 0.15,0.2 0.45,0.2 ; 0.75,-0.2 1.05,-0.2 ; 0.75,0.2 1.05,0.2 ; 1.322,-2.296 1.322,-2.525 ; 1.322,2.296 1.322,2.525 ; 2.296,-1.322 2.525,-1.322 ; 2.296,1.322 2.525,1.322 ; -2.525,-1.322 cw(c0,0) -2.525,1.322 ; -2.525,-1.322 -2.951,-1.875 ccw(c-2.872,-1.936) -2.943,-2.007 -2.007,-2.943 ccw(c-1.936,-2.872) -1.875,-2.951 -1.322,-2.525 ; -2.525,1.322 -2.951,1.875 cw(c-2.872,1.936) -2.943,2.007 -2.007,2.943 cw(c-1.936,2.872) -1.875,2.951 -1.322,2.525 ; -1.322,-2.525 ccw(c0,0) 1.322,-2.525 ; -1.322,2.525 cw(c0,0) 1.322,2.525 ; 1.322,-2.525 1.875,-2.951 ccw(c1.936,-2.872) 2.007,-2.943 2.943,-2.007 ccw(c2.872,-1.936) 2.951,-1.875 2.525,-1.322 ; 1.322,2.525 1.875,2.951 cw(c1.936,2.872) 2.007,2.943 2.943,2.007 cw(c2.872,1.936) 2.951,1.875 2.525,1.322 ; 2.525,-1.322 ccw(c0,0) 2.525,1.322 ; -3.85,-3.35 ccw(c-3.35,-3.35) -3.35,-3.85 3.35,-3.85 ccw(c3.35,-3.35) 3.85,-3.35 3.85,3.35 ccw(c3.35,3.35) 3.35,3.85 -3.35,3.85 ccw(c-3.35,3.35) -3.85,3.35 -3.85,-3.35
Mechanical 15:
  lines w0.05: -0.3,0 0.3,0 ; 0,-0.3 0,0.3 ; -4.1,-4.1 -4.1,4.1 4.1,4.1 4.1,-4.1 -4.1,-4.1
3D body "IND_WURTH_WE-DD-7332.stp": height 4, standoff 0, extent -3.65,-3.65 3.65,3.65

## IND_WURTH_WE-HCC_1210 [mm] "SMD High Current Cube Inductor (WE-HCC Series), Body 12.4x11.7mm"
height 10
pads (2):
  rect 2.9x5.4 smd: 1(-4.95,0) 2(4.95,0)
Top Overlay:
  lines w0.2: -6.2,-3.05 -6.2,-5.85 6.2,-5.85 6.2,-3.05 ; -6.2,3.05 -6.2,5.85 6.2,5.85 6.2,3.05
Mechanical 8:
  lines w0.05: -5.45,0 -4.95,0 ; -4.95,-0.5 -4.95,0 ; -4.95,0.5 -4.95,0 ; -4.45,0 -4.95,0 ; -0.5,0 0,0 ; 0,-0.5 0,0 ; 0,0.5 0,0 ; 0.5,0 0,0 ; 4.45,0 4.95,0 ; 4.95,-0.5 4.95,0 ; 4.95,0.5 4.95,0 ; 5.45,0 4.95,0 ; -6.4,-2.7 -3.5,-2.7 -3.5,2.7 -6.4,2.7 -6.4,-2.7 ; 3.5,-2.7 3.5,2.7 6.4,2.7 6.4,-2.7 3.5,-2.7
Mechanical 14:
  lines w0.1: -6.2,-5.85 6.2,-5.85 6.2,5.85 -6.2,5.85 -6.2,-5.85
Mechanical 15:
  lines w0.05: -6.65,-6.1 -6.65,6.1 6.65,6.1 6.65,-6.1 -6.65,-6.1
3D body "IND_WURTH_WE-HCC_1210.stp": height 9.5, standoff 0, extent -6.05,-5.7 6.05,5.7